# Altium schematic symbol library Capacitor - Aluminium TH.SchLib: 4591 symbols (part 2 of 27) (continued)
## 50ZLJ680M12.5X25 (continued)
CAP ALUM 680UF 20% 50V RADIAL; Part Number: 50ZLJ680M12.5X25; Manufacturer: Rubycon; TemperatureRange: -40C ~ 105C; Type: Polar; Ripple Current: 1.54A @ 120Hz; Impedance: 25 mOhm; Value: 680uF; PartId: 24049; Supplier 1: Digi-Key; Supplier Part Number 1: 1189-1436-ND; ComponentLink1Description: Datasheet; ComponentLink1URL: http://www.rubycon.co.jp/en/catalog/e_pdfs/aluminum/e_zlj.pdf; ComponentLink2Description: Digi-Key Listing; ComponentLink2URL: https://www.digikey.com/product-detail/en/rubycon/50ZLJ680M12.5X25/1189-1436-ND/3134392; Tolerance: 20%; Voltage: 50V; Price: 1.15; Device Package: Radial, Can, 12.5mm
footprint CAP AL TH D12.5 L5 H27
pins: 1, 2

## 50ZLJ820M12.5X30
designator C?, comment 820uF  (value not drawn)
CAP ALUM 820UF 20% 50V RADIAL; Part Number: 50ZLJ820M12.5X30; Manufacturer: Rubycon; TemperatureRange: -40C ~ 105C; Type: Polar; Ripple Current: 2.022A @ 120Hz; Impedance: 23 mOhm; Value: 820uF; PartId: 24350; Supplier 1: Digi-Key; Supplier Part Number 1: 1189-1437-ND; ComponentLink1Description: Datasheet; ComponentLink1URL: http://www.rubycon.co.jp/en/catalog/e_pdfs/aluminum/e_zlj.pdf; ComponentLink2Description: Digi-Key Listing; ComponentLink2URL: https://www.digikey.com/product-detail/en/rubycon/50ZLJ820M12.5X30/1189-1437-ND/3134393; Tolerance: 20%; Voltage: 50V; Price: 1.39; Device Package: Radial, Can, 12.5mm
footprint CAP AL TH D12.5 L5 H35.5
pins: 1, 2

## 50ZLJ1000M16X25
designator C?, comment 1000uF  (value not drawn)
CAP ALUM 1000UF 20% 50V RADIAL; Part Number: 50ZLJ1000M16X25; Manufacturer: Rubycon; TemperatureRange: -40C ~ 105C; Type: Polar; Ripple Current: 2.106A @ 120Hz; Impedance: 22 mOhm; Value: 1000uF; PartId: 26922; Supplier 1: Digi-Key; Supplier Part Number 1: 1189-1430-ND; ComponentLink1Description: Datasheet; ComponentLink1URL: http://www.rubycon.co.jp/en/catalog/e_pdfs/aluminum/e_zlj.pdf; ComponentLink2Description: Digi-Key Listing; ComponentLink2URL: https://www.digikey.com/product-detail/en/rubycon/50ZLJ1000M16X25/1189-1430-ND/3134386; Tolerance: 20%; Voltage: 50V; Price: 1.7; Device Package: Radial, Can, 16mm
footprint CAP AL TH D16 L7.5 H27
pins: 1, 2

## 63PX330MEFC10X20
designator C?, comment 330uF  (value not drawn)
CAP ALUM 330UF 20% 63V RADIAL; Part Number: 63PX330MEFC10X20; Manufacturer: Rubycon; TemperatureRange: -55C ~ 105C; Type: Polar; Ripple Current: 540mA; Value: 330uF; PartId: 25676; Supplier 1: Digi-Key; Supplier Part Number 1: 1189-1476-ND; ComponentLink1Description: Datasheet; ComponentLink1URL: http://www.rubycon.co.jp/en/catalog/e_pdfs/aluminum/e_px.pdf; ComponentLink2Description: Digi-Key Listing; ComponentLink2URL: https://www.digikey.com/product-detail/en/rubycon/63PX330MEFC10X20/1189-1476-ND/3134432; Tolerance: 20%; Voltage: 63V; Price: 0.78; Device Package: Radial, Can, 10mm
footprint CAP AL TH D10 L5 H22
pins: 1, 2

## 63PX470MEFC12.5X20
designator C?, comment 470uF  (value not drawn)
CAP ALUM 470UF 20% 63V RADIAL; Part Number: 63PX470MEFC12.5X20; Manufacturer: Rubycon; TemperatureRange: -55C ~ 105C; Type: Polar; Ripple Current: 700mA; Value: 470uF; PartId: 23016; Supplier 1: Digi-Key; Supplier Part Number 1: 1189-1478-ND; ComponentLink1Description: Datasheet; ComponentLink1URL: http://www.rubycon.co.jp/en/catalog/e_pdfs/aluminum/e_px.pdf; ComponentLink2Description: Digi-Key Listing; ComponentLink2URL: https://www.digikey.com/product-detail/en/rubycon/63PX470MEFC12.5X20/1189-1478-ND/3134434; Tolerance: 20%; Voltage: 63V; Price: 0; Device Package: Radial, Can, 12.5mm
footprint CAP AL TH D12.5 L5 H21.5
pins: 1, 2

## 63PX1000MEFC16X25
designator C?, comment 1000uF  (value not drawn)
CAP ALUM 1000UF 20% 63V RADIAL; Part Number: 63PX1000MEFC16X25; Manufacturer: Rubycon; TemperatureRange: -55C ~ 105C; Type: Polar; Ripple Current: 1.2A; Value: 1000uF; PartId: 26604; Supplier 1: Digi-Key; Supplier Part Number 1: 1189-1473-ND; ComponentLink1Description: Datasheet; ComponentLink1URL: http://www.rubycon.co.jp/en/catalog/e_pdfs/aluminum/e_px.pdf; ComponentLink2Description: Digi-Key Listing; ComponentLink2URL: https://www.digikey.com/product-detail/en/rubycon/63PX1000MEFC16X25/1189-1473-ND/3134429; Tolerance: 20%; Voltage: 63V; Price: 1.36; Device Package: Radial, Can, 16mm
footprint CAP AL TH D16 L7.5 H26.5
pins: 1, 2

## 63RX30100M10X16
designator C?, comment 100uF  (value not drawn)
CAP ALUM 100UF 20% 63V RADIAL; Part Number: 63RX30100M10X16; Manufacturer: Rubycon; TemperatureRange: -40C ~ 130C; Type: Polar; Ripple Current: 315mA; Impedance: 200 mOhm; Value: 100uF; PartId: 25525; Supplier 1: Digi-Key; Supplier Part Number 1: 1189-1480-ND; ComponentLink1Description: Datasheet; ComponentLink1URL: http://www.rubycon.co.jp/en/catalog/e_pdfs/aluminum/e_rx30.pdf; ComponentLink2Description: Digi-Key Listing; ComponentLink2URL: https://www.digikey.com/product-detail/en/rubycon/63RX30100M10X16/1189-1480-ND/3134436; Tolerance: 20%; Voltage: 63V; Price: 0.6; Device Package: Radial, Can, 10mm
footprint CAP AL TH D10 L5 H22
pins: 1, 2

## 63RX30220MG412.5X20
designator C?, comment 220uF  (value not drawn)
CAP ALUM 220UF 20% 63V RADIAL; Part Number: 63RX30220MG412.5X20; Manufacturer: Rubycon; TemperatureRange: -40C ~ 130C; Type: Polar; Ripple Current: 574mA; Impedance: 100 mOhm; Value: 220uF; PartId: 23395; Supplier 1: Digi-Key; Supplier Part Number 1: 1189-1676-1-ND; ComponentLink1Description: Datasheet; ComponentLink1URL: http://www.rubycon.co.jp/en/catalog/e_pdfs/aluminum/e_rx30.pdf; ComponentLink2Description: Digi-Key Listing; ComponentLink2URL: https://www.digikey.com/product-detail/en/rubycon/63RX30220MG412.5X20/1189-1676-1-ND/3134633; Tolerance: 20%; Voltage: 63V; Price: 0.96; Device Package: Radial, Can, 12.5mm
footprint CAP AL TH D12.5 L5 H22
pins: 1, 2

## 63RX30330MG412.5X25
designator C?, comment 330uF  (value not drawn)
CAP ALUM 330UF 20% 63V RADIAL; Part Number: 63RX30330MG412.5X25; Manufacturer: Rubycon; TemperatureRange: -40C ~ 130C; Type: Polar; Ripple Current: 1A; Impedance: 72 mOhm; Value: 330uF; PartId: 24126; Supplier 1: Digi-Key; Supplier Part Number 1: 1189-1677-1-ND; ComponentLink1Description: Datasheet; ComponentLink1URL: http://www.rubycon.co.jp/en/catalog/e_pdfs/aluminum/e_rx30.pdf; ComponentLink2Description: Digi-Key Listing; ComponentLink2URL: https://www.digikey.com/product-detail/en/rubycon/63RX30330MG412.5X25/1189-1677-1-ND/3134634; Tolerance: 20%; Voltage: 63V; Price: 1.43; Device Package: Radial, Can, 12.5mm
footprint CAP AL TH D12.5 L5 H27
pins: 1, 2

## 63YXG120MEFC10X16
designator C?, comment 120uF  (value not drawn)
CAP ALUM 120UF 20% 63V RADIAL; Part Number: 63YXG120MEFC10X16; Manufacturer: Rubycon; TemperatureRange: -40C ~ 105C; Type: Polar; Ripple Current: 178.5mA @ 120Hz; Impedance: 310 mOhm; Value: 120uF; PartId: 25353; Supplier 1: Digi-Key; Supplier Part Number 1: 1189-1491-ND; ComponentLink1Description: Datasheet; ComponentLink1URL: http://www.rubycon.co.jp/en/catalog/e_pdfs/aluminum/e_yxg.pdf; ComponentLink2Description: Digi-Key Listing; ComponentLink2URL: https://www.digikey.com/product-detail/en/rubycon/63YXG120MEFC10X16/1189-1491-ND/3134447; Tolerance: 20%; Voltage: 63V; Price: 0.69; Device Package: Radial, Can, 10mm
footprint CAP AL TH D10 L5 H17.5
pins: 1, 2

## 63YXJ470M12.5X25
designator C?, comment 470uF  (value not drawn)
CAP ALUM 470UF 20% 63V RADIAL; Part Number: 63YXJ470M12.5X25; Manufacturer: Rubycon; TemperatureRange: -40C ~ 105C; Type: Polar; Ripple Current: 1.99A; Impedance: 43 mOhm; Value: 470uF; PartId: 23873; Supplier 1: Digi-Key; Supplier Part Number 1: 1189-1501-ND; ComponentLink1Description: Datasheet; ComponentLink1URL: http://www.rubycon.co.jp/en/catalog/e_pdfs/aluminum/e_yxj.pdf; ComponentLink2Description: Digi-Key Listing; ComponentLink2URL: https://www.digikey.com/product-detail/en/rubycon/63YXJ470M12.5X25/1189-1501-ND/3134457; Tolerance: 20%; Voltage: 63V; Price: 0.82; Device Package: Radial, Can, 12.5mm
footprint CAP AL TH D12.5 L5 H27
pins: 1, 2

## 63ZLH270MEFC10X20
designator C?, comment 270uF  (value not drawn)
CAP ALUM 270UF 20% 63V RADIAL; Part Number: 63ZLH270MEFC10X20; Manufacturer: Rubycon; TemperatureRange: -40C ~ 105C; Type: Polar; Ripple Current: 600mA @ 120Hz; Impedance: 78 mOhm; Value: 270uF; PartId: 25954; Supplier 1: Digi-Key; Supplier Part Number 1: 1189-3031-ND; ComponentLink1Description: Datasheet; ComponentLink1URL: http://www.rubycon.co.jp/en/catalog/e_pdfs/aluminum/e_zlh.pdf; ComponentLink2Description: Digi-Key Listing; ComponentLink2URL: https://www.digikey.com/product-detail/en/rubycon/63ZLH270MEFC10X20/1189-3031-ND/3563820; Tolerance: 20%; Voltage: 63V; Price: 0.78; Device Package: Radial, Can, 10mm
footprint CAP AL TH D10 L5 H22
pins: 1, 2

## 63ZLH270MEFC12.5X16
designator C?, comment 270uF  (value not drawn)
CAP ALUM 270UF 20% 63V RADIAL; Part Number: 63ZLH270MEFC12.5X16; Manufacturer: Rubycon; TemperatureRange: -40C ~ 105C; Type: Polar; Ripple Current: 600mA; Impedance: 82 mOhm; Value: 270uF; PartId: 22828; Supplier 1: Digi-Key; Supplier Part Number 1: 1189-2357-ND; ComponentLink1Description: Datasheet; ComponentLink1URL: http://www.rubycon.co.jp/en/catalog/e_pdfs/aluminum/e_zlh.pdf; ComponentLink2Description: Digi-Key Listing; ComponentLink2URL: https://www.digikey.com/product-detail/en/rubycon/63ZLH270MEFC12.5X16/1189-2357-ND/3563974; Tolerance: 20%; Voltage: 63V; Price: 0; Device Package: Radial, Can, 12.5mm
footprint CAP AL TH D12.5 L5 H17.5
pins: 1, 2

## 63ZLH330MEFC10X23
designator C?, comment 330uF  (value not drawn)
CAP ALUM 330UF 20% 63V RADIAL; Part Number: 63ZLH330MEFC10X23; Manufacturer: Rubycon; TemperatureRange: -40C ~ 105C; Type: Polar; Ripple Current: 775.5mA; Impedance: 69 mOhm; Value: 330uF; PartId: 26140; Supplier 1: Digi-Key; Supplier Part Number 1: 1189-1766-ND; ComponentLink1Description: Datasheet; ComponentLink1URL: http://www.rubycon.co.jp/en/catalog/e_pdfs/aluminum/e_zlh.pdf; ComponentLink2Description: Digi-Key Listing; ComponentLink2URL: https://www.digikey.com/product-detail/en/rubycon/63ZLH330MEFC10X23/1189-1766-ND/3563862; Tolerance: 20%; Voltage: 63V; Price: 0.83; Device Package: Radial, Can, 10mm
footprint CAP AL TH D10 L5 H30
pins: 1, 2

## 63ZLH390MEFC12.5X20
designator C?, comment 390uF  (value not drawn)
CAP ALUM 390UF 20% 63V RADIAL; Part Number: 63ZLH390MEFC12.5X20; Manufacturer: Rubycon; TemperatureRange: -40C ~ 105C; Type: Polar; Ripple Current: 863.5mA @ 120Hz; Impedance: 60 mOhm; Value: 390uF; PartId: 23464; Supplier 1: Digi-Key; Supplier Part Number 1: 1189-3032-ND; ComponentLink1Description: Datasheet; ComponentLink1URL: http://www.rubycon.co.jp/en/catalog/e_pdfs/aluminum/e_zlh.pdf; ComponentLink2Description: Digi-Key Listing; ComponentLink2URL: https://www.digikey.com/product-detail/en/rubycon/63ZLH390MEFC12.5X20/1189-3032-ND/3564060; Tolerance: 20%; Voltage: 63V; Price: 1.07; Device Package: Radial, Can, 12.5mm
footprint CAP AL TH D12.5 L5 H22
pins: 1, 2

## 63ZLH470MEFC12.5X25
designator C?, comment 470uF  (value not drawn)
CAP ALUM 470UF 20% 63V RADIAL; Part Number: 63ZLH470MEFC12.5X25; Manufacturer: Rubycon; TemperatureRange: -40C ~ 105C; Type: Polar; Ripple Current: 1.0945A @ 120Hz; Impedance: 43 mOhm; Value: 470uF; PartId: 24069; Supplier 1: Digi-Key; Supplier Part Number 1: 1189-3033-ND; ComponentLink1Description: Datasheet; ComponentLink1URL: http://www.rubycon.co.jp/en/catalog/e_pdfs/aluminum/e_zlh.pdf; ComponentLink2Description: Digi-Key Listing; ComponentLink2URL: https://www.digikey.com/product-detail/en/rubycon/63ZLH470MEFC12.5X25/1189-3033-ND/3564146; Tolerance: 20%; Voltage: 63V; Price: 1.2; Device Package: Radial, Can, 12.5mm
footprint CAP AL TH D12.5 L5 H27
pins: 1, 2

## 63ZLH560MEFC12.5X30
designator C?, comment 560uF  (value not drawn)
CAP ALUM 560UF 20% 63V RADIAL; Part Number: 63ZLH560MEFC12.5X30; Manufacturer: Rubycon; TemperatureRange: -40C ~ 105C; Type: Polar; Ripple Current: 1.326A; Impedance: 35 mOhm; Value: 560uF; PartId: 24275; Supplier 1: Digi-Key; Supplier Part Number 1: 1189-1507-ND; ComponentLink1Description: Datasheet; ComponentLink1URL: http://www.rubycon.co.jp/en/catalog/e_pdfs/aluminum/e_zlh.pdf; ComponentLink2Description: Digi-Key Listing; ComponentLink2URL: https://www.digikey.com/product-detail/en/rubycon/63ZLH560MEFC12.5X30/1189-1507-ND/3134463; Tolerance: 20%; Voltage: 63V; Price: 1.08; Device Package: Radial, Can, 12.5mm
footprint CAP AL TH D12.5 L5 H35.5
pins: 1, 2

## 63ZLH560MEFC16X20
designator C?, comment 560uF  (value not drawn)
CAP ALUM 560UF 20% 63V RADIAL; Part Number: 63ZLH560MEFC16X20; Manufacturer: Rubycon; TemperatureRange: -40C ~ 105C; Type: Polar; Ripple Current: 1.155A @ 120Hz; Impedance: 43 mOhm; Value: 560uF; PartId: 26466; Supplier 1: Digi-Key; Supplier Part Number 1: 1189-3035-ND; ComponentLink1Description: Datasheet; ComponentLink1URL: http://www.rubycon.co.jp/en/catalog/e_pdfs/aluminum/e_zlh.pdf; ComponentLink2Description: Digi-Key Listing; ComponentLink2URL: https://www.digikey.com/product-detail/en/rubycon/63ZLH560MEFC16X20/1189-3035-ND/3564404; Tolerance: 20%; Voltage: 63V; Price: 1.55; Device Package: Radial, Can, 16mm
footprint CAP AL TH D16 L7.5 H22
pins: 1, 2

## 63ZLH820MEFC16X25
designator C?, comment 820uF  (value not drawn)
CAP ALUM 820UF 20% 63V RADIAL; Part Number: 63ZLH820MEFC16X25; Manufacturer: Rubycon; TemperatureRange: -40C ~ 105C; Type: Polar; Ripple Current: 1.638A @ 120Hz; Impedance: 32 mOhm; Value: 820uF; PartId: 26932; Supplier 1: Digi-Key; Supplier Part Number 1: 1189-3037-ND; ComponentLink1Description: Datasheet; ComponentLink1URL: http://www.rubycon.co.jp/en/catalog/e_pdfs/aluminum/e_zlh.pdf; ComponentLink2Description: Digi-Key Listing; ComponentLink2URL: https://www.digikey.com/product-detail/en/rubycon/63ZLH820MEFC16X25/1189-3037-ND/3564487; Tolerance: 20%; Voltage: 63V; Price: 1.82; Device Package: Radial, Can, 16mm
footprint CAP AL TH D16 L7.5 H27
pins: 1, 2

## 63ZLH1200MEFC16X31.5
designator C?, comment 1200uF  (value not drawn)
CAP ALUM 1200UF 20% 63V RADIAL; Part Number: 63ZLH1200MEFC16X31.5; Manufacturer: Rubycon; TemperatureRange: -40C ~ 105C; Type: Polar; Ripple Current: 1.794A; Impedance: 24 mOhm; Value: 1200uF; PartId: 27170; Supplier 1: Digi-Key; Supplier Part Number 1: 1189-1503-ND; ComponentLink1Description: Datasheet; ComponentLink1URL: http://www.rubycon.co.jp/en/catalog/e_pdfs/aluminum/e_zlh.pdf; ComponentLink2Description: Digi-Key Listing; ComponentLink2URL: https://www.digikey.com/product-detail/en/rubycon/63ZLH1200MEFC16X31.5/1189-1503-ND/3134459; Tolerance: 20%; Voltage: 63V; Price: 1.9; Device Package: Radial, Can, 16mm
footprint CAP AL TH D16 L7.5 H33.5
pins: 1, 2

## 63ZLJ180M10X16
designator C?, comment 180uF  (value not drawn)
CAP ALUM 180UF 20% 63V RADIAL; Part Number: 63ZLJ180M10X16; Manufacturer: Rubycon; TemperatureRange: -40C ~ 105C; Type: Polar; Ripple Current: 600mA @ 120Hz; Impedance: 76 mOhm; Value: 180uF; PartId: 25415; Supplier 1: Digi-Key; Supplier Part Number 1: 1189-2360-ND; ComponentLink1Description: Datasheet; ComponentLink1URL: http://www.rubycon.co.jp/en/catalog/e_pdfs/aluminum/e_zlj.pdf; ComponentLink2Description: Digi-Key Listing; ComponentLink2URL: https://www.digikey.com/product-detail/en/rubycon/63ZLJ180M10X16/1189-2360-ND/3563728; Tolerance: 20%; Voltage: 63V; Price: 0.9; Device Package: Radial, Can, 10mm
footprint CAP AL TH D10 L5 H17.5
pins: 1, 2

## 63ZLJ270M10X20
designator C?, comment 270uF  (value not drawn)
CAP ALUM 270UF 20% 63V RADIAL; Part Number: 63ZLJ270M10X20; Manufacturer: Rubycon; TemperatureRange: -40C ~ 105C; Type: Polar; Ripple Current: 785mA @ 120Hz; Impedance: 56 mOhm; Value: 270uF; PartId: 25935; Supplier 1: Digi-Key; Supplier Part Number 1: 1189-1510-ND; ComponentLink1Description: Datasheet; ComponentLink1URL: http://www.rubycon.co.jp/en/catalog/e_pdfs/aluminum/e_zlj.pdf; ComponentLink2Description: Digi-Key Listing; ComponentLink2URL: https://www.digikey.com/product-detail/en/rubycon/63ZLJ270M10X20/1189-1510-ND/3134466; Tolerance: 20%; Voltage: 63V; Price: 0.74; Device Package: Radial, Can, 10mm
footprint CAP AL TH D10 L5 H22
pins: 1, 2

## 63ZLJ470M12.5X25
designator C?, comment 470uF  (value not drawn)
CAP ALUM 470UF 20% 63V RADIAL; Part Number: 63ZLJ470M12.5X25; Manufacturer: Rubycon; TemperatureRange: -40C ~ 105C; Type: Polar; Ripple Current: 1.353A @ 120Hz; Impedance: 31 mOhm; Value: 470uF; PartId: 24113; Supplier 1: Digi-Key; Supplier Part Number 1: 1189-2362-ND; ComponentLink1Description: Datasheet; ComponentLink1URL: http://www.rubycon.co.jp/en/catalog/e_pdfs/aluminum/e_zlj.pdf; ComponentLink2Description: Digi-Key Listing; ComponentLink2URL: https://www.digikey.com/product-detail/en/rubycon/63ZLJ470M12.5X25/1189-2362-ND/3564153; Tolerance: 20%; Voltage: 63V; Price: 1.38; Device Package: Radial, Can, 12.5mm
footprint CAP AL TH D12.5 L5 H27
pins: 1, 2

## 63ZLJ560M12.5X30
designator C?, comment 560uF  (value not drawn)
CAP ALUM 560UF 20% 63V RADIAL; Part Number: 63ZLJ560M12.5X30; Manufacturer: Rubycon; TemperatureRange: -40C ~ 105C; Type: Polar; Ripple Current: 1.353A @ 120Hz; Impedance: 28 mOhm; Value: 560uF; PartId: 24375; Supplier 1: Digi-Key; Supplier Part Number 1: 1189-2363-ND; ComponentLink1Description: Datasheet; ComponentLink1URL: http://www.rubycon.co.jp/en/catalog/e_pdfs/aluminum/e_zlj.pdf; ComponentLink2Description: Digi-Key Listing; ComponentLink2URL: https://www.digikey.com/product-detail/en/rubycon/63ZLJ560M12.5X30/1189-2363-ND/3564208; Tolerance: 20%; Voltage: 63V; Price: 1.65; Device Package: Radial, Can, 12.5mm
footprint CAP AL TH D12.5 L5 H35.5
pins: 1, 2

## 63ZLJ560MGC16X20
designator C?, comment 560uF  (value not drawn)
CAP ALUM 560UF 20% 63V RADIAL; Part Number: 63ZLJ560MGC16X20; Manufacturer: Rubycon; TemperatureRange: -40C ~ 105C; Type: Polar; Ripple Current: 1.309A @ 120Hz; Impedance: 32 mOhm; Value: 560uF; PartId: 26382; Supplier 1: Digi-Key; Supplier Part Number 1: 1189-1679-3-ND; ComponentLink1Description: Datasheet; ComponentLink1URL: http://www.rubycon.co.jp/en/catalog/e_pdfs/aluminum/e_zlj.pdf; ComponentLink2Description: Digi-Key Listing; ComponentLink2URL: https://www.digikey.com/product-detail/en/rubycon/63ZLJ560MGC16X20/1189-1679-3-ND/3134958; Tolerance: 20%; Voltage: 63V; Price: 0.771; Device Package: Radial, Can, 16mm
footprint CAP AL TH D16 L7.5 H22
pins: 1, 2

## 80ZLH120MEFC10X16
designator C?, comment 120uF  (value not drawn)
CAP ALUM 120UF 20% 80V RADIAL; Part Number: 80ZLH120MEFC10X16; Manufacturer: Rubycon; TemperatureRange: -40C ~ 105C; Type: Polar; Ripple Current: 390mA @ 120Hz; Impedance: 170 mOhm; Value: 120uF; PartId: 25325; Supplier 1: Digi-Key; Supplier Part Number 1: 1189-3043-ND; ComponentLink1Description: Datasheet; ComponentLink1URL: http://www.rubycon.co.jp/en/catalog/e_pdfs/aluminum/e_zlh.pdf; ComponentLink2Description: Digi-Key Listing; ComponentLink2URL: https://www.digikey.com/product-detail/en/rubycon/80ZLH120MEFC10X16/1189-3043-ND/3563726; Tolerance: 20%; Voltage: 80V; Price: 0.66; Device Package: Radial, Can, 10mm
footprint CAP AL TH D10 L5 H17.5
pins: 1, 2

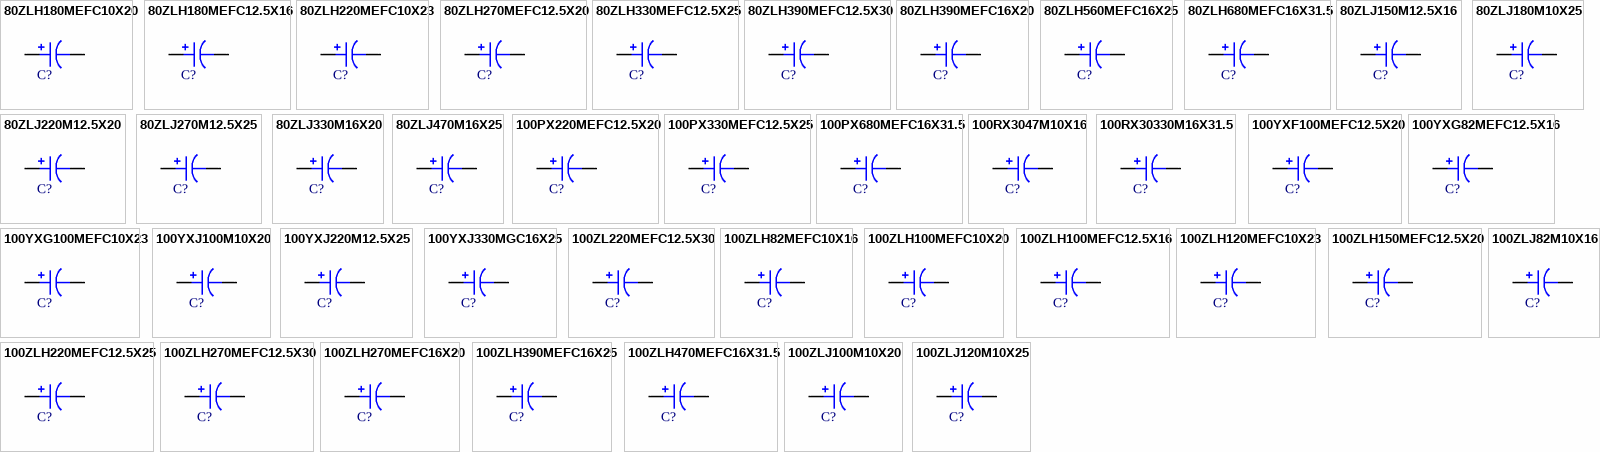
[diagram p7: symbols 80ZLH180MEFC10X20 to 100ZLJ120M10X25]

## 80ZLH180MEFC10X20
designator C?, comment 180uF  (value not drawn)
CAP ALUM 180UF 20% 80V RADIAL; Part Number: 80ZLH180MEFC10X20; Manufacturer: Rubycon; TemperatureRange: -40C ~ 105C; Type: Polar; Ripple Current: 520mA @ 120Hz; Impedance: 120 mOhm; Value: 180uF; PartId: 25959; Supplier 1: Digi-Key; Supplier Part Number 1: 1189-3046-ND; ComponentLink1Description: Datasheet; ComponentLink1URL: http://www.rubycon.co.jp/en/catalog/e_pdfs/aluminum/e_zlh.pdf; ComponentLink2Description: Digi-Key Listing; ComponentLink2URL: https://www.digikey.com/product-detail/en/rubycon/80ZLH180MEFC10X20/1189-3046-ND/3563821; Tolerance: 20%; Voltage: 80V; Price: 0.81; Device Package: Radial, Can, 10mm
footprint CAP AL TH D10 L5 H22
pins: 1, 2

## 80ZLH180MEFC12.5X16
designator C?, comment 180uF  (value not drawn)
CAP ALUM 180UF 20% 80V RADIAL; Part Number: 80ZLH180MEFC12.5X16; Manufacturer: Rubycon; TemperatureRange: -40C ~ 105C; Type: Polar; Ripple Current: 487.5mA @ 120Hz; Impedance: 130 mOhm; Value: 180uF; PartId: 22818; Supplier 1: Digi-Key; Supplier Part Number 1: 1189-3047-ND; ComponentLink1Description: Datasheet; ComponentLink1URL: http://www.rubycon.co.jp/en/catalog/e_pdfs/aluminum/e_zlh.pdf; ComponentLink2Description: Digi-Key Listing; ComponentLink2URL: https://www.digikey.com/product-detail/en/rubycon/80ZLH180MEFC12.5X16/1189-3047-ND/3563975; Tolerance: 20%; Voltage: 80V; Price: 0; Device Package: Radial, Can, 12.5mm
footprint CAP AL TH D12.5 L5 H17.5
pins: 1, 2

## 80ZLH220MEFC10X23
designator C?, comment 220uF  (value not drawn)
CAP ALUM 220UF 20% 80V RADIAL; Part Number: 80ZLH220MEFC10X23; Manufacturer: Rubycon; TemperatureRange: -40C ~ 105C; Type: Polar; Ripple Current: 585mA @ 120Hz; Impedance: 110 mOhm; Value: 220uF; PartId: 26157; Supplier 1: Digi-Key; Supplier Part Number 1: 1189-3048-ND; ComponentLink1Description: Datasheet; ComponentLink1URL: http://www.rubycon.co.jp/en/catalog/e_pdfs/aluminum/e_zlh.pdf; ComponentLink2Description: Digi-Key Listing; ComponentLink2URL: https://www.digikey.com/product-detail/en/rubycon/80ZLH220MEFC10X23/1189-3048-ND/3563865; Tolerance: 20%; Voltage: 80V; Price: 0.86; Device Package: Radial, Can, 10mm
footprint CAP AL TH D10 L5 H30
pins: 1, 2

## 80ZLH270MEFC12.5X20
designator C?, comment 270uF  (value not drawn)
CAP ALUM 270UF 20% 80V RADIAL; Part Number: 80ZLH270MEFC12.5X20; Manufacturer: Rubycon; TemperatureRange: -40C ~ 105C; Type: Polar; Ripple Current: 715mA @ 120Hz; Impedance: 85 mOhm; Value: 270uF; PartId: 23435; Supplier 1: Digi-Key; Supplier Part Number 1: 1189-3049-ND; ComponentLink1Description: Datasheet; ComponentLink1URL: http://www.rubycon.co.jp/en/catalog/e_pdfs/aluminum/e_zlh.pdf; ComponentLink2Description: Digi-Key Listing; ComponentLink2URL: https://www.digikey.com/product-detail/en/rubycon/80ZLH270MEFC12.5X20/1189-3049-ND/3564063; Tolerance: 20%; Voltage: 80V; Price: 1.01; Device Package: Radial, Can, 12.5mm
footprint CAP AL TH D12.5 L5 H22
pins: 1, 2

## 80ZLH330MEFC12.5X25
designator C?, comment 330uF  (value not drawn)
CAP ALUM 330UF 20% 80V RADIAL; Part Number: 80ZLH330MEFC12.5X25; Manufacturer: Rubycon; TemperatureRange: -40C ~ 105C; Type: Polar; Ripple Current: 891mA @ 120Hz; Impedance: 60 mOhm; Value: 330uF; PartId: 24065; Supplier 1: Digi-Key; Supplier Part Number 1: 1189-3050-ND; ComponentLink1Description: Datasheet; ComponentLink1URL: http://www.rubycon.co.jp/en/catalog/e_pdfs/aluminum/e_zlh.pdf; ComponentLink2Description: Digi-Key Listing; ComponentLink2URL: https://www.digikey.com/product-detail/en/rubycon/80ZLH330MEFC12.5X25/1189-3050-ND/3564148; Tolerance: 20%; Voltage: 80V; Price: 1.19; Device Package: Radial, Can, 12.5mm
footprint CAP AL TH D12.5 L5 H27
pins: 1, 2

## 80ZLH390MEFC12.5X30
designator C?, comment 390uF  (value not drawn)
CAP ALUM 390UF 20% 80V RADIAL; Part Number: 80ZLH390MEFC12.5X30; Manufacturer: Rubycon; TemperatureRange: -40C ~ 105C; Type: Polar; Ripple Current: 1.0725A @ 120Hz; Impedance: 51 mOhm; Value: 390uF; PartId: 24354; Supplier 1: Digi-Key; Supplier Part Number 1: 1189-3052-ND; ComponentLink1Description: Datasheet; ComponentLink1URL: http://www.rubycon.co.jp/en/catalog/e_pdfs/aluminum/e_zlh.pdf; ComponentLink2Description: Digi-Key Listing; ComponentLink2URL: https://www.digikey.com/product-detail/en/rubycon/80ZLH390MEFC12.5X30/1189-3052-ND/3564203; Tolerance: 20%; Voltage: 80V; Price: 1.43; Device Package: Radial, Can, 12.5mm
footprint CAP AL TH D12.5 L5 H35.5
pins: 1, 2

## 80ZLH390MEFC16X20
designator C?, comment 390uF  (value not drawn)
CAP ALUM 390UF 20% 80V RADIAL; Part Number: 80ZLH390MEFC16X20; Manufacturer: Rubycon; TemperatureRange: -40C ~ 105C; Type: Polar; Ripple Current: 962.5mA @ 120Hz; Impedance: 58 mOhm; Value: 390uF; PartId: 26465; Supplier 1: Digi-Key; Supplier Part Number 1: 1189-3053-ND; ComponentLink1Description: Datasheet; ComponentLink1URL: http://www.rubycon.co.jp/en/catalog/e_pdfs/aluminum/e_zlh.pdf; ComponentLink2Description: Digi-Key Listing; ComponentLink2URL: https://www.digikey.com/product-detail/en/rubycon/80ZLH390MEFC16X20/1189-3053-ND/3564406; Tolerance: 20%; Voltage: 80V; Price: 1.55; Device Package: Radial, Can, 16mm
footprint CAP AL TH D16 L7.5 H22
pins: 1, 2

## 80ZLH560MEFC16X25
designator C?, comment 560uF  (value not drawn)
CAP ALUM 560UF 20% 80V RADIAL; Part Number: 80ZLH560MEFC16X25; Manufacturer: Rubycon; TemperatureRange: -40C ~ 105C; Type: Polar; Ripple Current: 1.2155A @ 120Hz; Impedance: 44 mOhm; Value: 560uF; PartId: 26933; Supplier 1: Digi-Key; Supplier Part Number 1: 1189-3056-ND; ComponentLink1Description: Datasheet; ComponentLink1URL: http://www.rubycon.co.jp/en/catalog/e_pdfs/aluminum/e_zlh.pdf; ComponentLink2Description: Digi-Key Listing; ComponentLink2URL: https://www.digikey.com/product-detail/en/rubycon/80ZLH560MEFC16X25/1189-3056-ND/3564490; Tolerance: 20%; Voltage: 80V; Price: 1.82; Device Package: Radial, Can, 16mm
footprint CAP AL TH D16 L7.5 H27
pins: 1, 2

## 80ZLH680MEFC16X31.5
designator C?, comment 680uF  (value not drawn)
CAP ALUM 680UF 20% 80V RADIAL; Part Number: 80ZLH680MEFC16X31.5; Manufacturer: Rubycon; TemperatureRange: -40C ~ 105C; Type: Polar; Ripple Current: 1.32A @ 120Hz; Impedance: 33 mOhm; Value: 680uF; PartId: 27208; Supplier 1: Digi-Key; Supplier Part Number 1: 1189-3059-ND; ComponentLink1Description: Datasheet; ComponentLink1URL: http://www.rubycon.co.jp/en/catalog/e_pdfs/aluminum/e_zlh.pdf; ComponentLink2Description: Digi-Key Listing; ComponentLink2URL: https://www.digikey.com/product-detail/en/rubycon/80ZLH680MEFC16X31.5/1189-3059-ND/3564547; Tolerance: 20%; Voltage: 80V; Price: 2.16; Device Package: Radial, Can, 16mm
footprint CAP AL TH D16 L7.5 H33.5
pins: 1, 2

## 80ZLJ150M12.5X16
designator C?, comment 150uF  (value not drawn)
CAP ALUM 150UF 20% 80V RADIAL; Part Number: 80ZLJ150M12.5X16; Manufacturer: Rubycon; TemperatureRange: -40C ~ 105C; Type: Polar; Ripple Current: 715mA @ 120Hz; Impedance: 110 mOhm; Value: 150uF; PartId: 22830; Supplier 1: Digi-Key; Supplier Part Number 1: 1189-2365-ND; ComponentLink1Description: Datasheet; ComponentLink1URL: http://www.rubycon.co.jp/en/catalog/e_pdfs/aluminum/e_zlj.pdf; ComponentLink2Description: Digi-Key Listing; ComponentLink2URL: https://www.digikey.com/product-detail/en/rubycon/80ZLJ150M12.5X16/1189-2365-ND/3563978; Tolerance: 20%; Voltage: 80V; Price: 0; Device Package: Radial, Can, 12.5mm
footprint CAP AL TH D12.5 L5 H17.5
pins: 1, 2

## 80ZLJ180M10X25
designator C?, comment 180uF  (value not drawn)
CAP ALUM 180UF 20% 80V RADIAL; Part Number: 80ZLJ180M10X25; Manufacturer: Rubycon; TemperatureRange: -40C ~ 105C; Type: Polar; Ripple Current: 810mA @ 120Hz; Impedance: 69 mOhm; Value: 180uF; PartId: 26186; Supplier 1: Digi-Key; Supplier Part Number 1: 1189-2366-ND; ComponentLink1Description: Datasheet; ComponentLink1URL: http://www.rubycon.co.jp/en/catalog/e_pdfs/aluminum/e_zlj.pdf; ComponentLink2Description: Digi-Key Listing; ComponentLink2URL: https://www.digikey.com/product-detail/en/rubycon/80ZLJ180M10X25/1189-2366-ND/3563878; Tolerance: 20%; Voltage: 80V; Price: 1.02; Device Package: Radial, Can, 10mm
footprint CAP AL TH D10 L5 H30
pins: 1, 2

## 80ZLJ220M12.5X20
designator C?, comment 220uF  (value not drawn)
CAP ALUM 220UF 20% 80V RADIAL; Part Number: 80ZLJ220M12.5X20; Manufacturer: Rubycon; TemperatureRange: -40C ~ 105C; Type: Polar; Ripple Current: 875mA @ 120Hz; Impedance: 62 mOhm; Value: 220uF; PartId: 23487; Supplier 1: Digi-Key; Supplier Part Number 1: 1189-2367-ND; ComponentLink1Description: Datasheet; ComponentLink1URL: http://www.rubycon.co.jp/en/catalog/e_pdfs/aluminum/e_zlj.pdf; ComponentLink2Description: Digi-Key Listing; ComponentLink2URL: https://www.digikey.com/product-detail/en/rubycon/80ZLJ220M12.5X20/1189-2367-ND/3564071; Tolerance: 20%; Voltage: 80V; Price: 1.17; Device Package: Radial, Can, 12.5mm
footprint CAP AL TH D12.5 L5 H22
pins: 1, 2

## 80ZLJ270M12.5X25
designator C?, comment 270uF  (value not drawn)
CAP ALUM 270UF 20% 80V RADIAL; Part Number: 80ZLJ270M12.5X25; Manufacturer: Rubycon; TemperatureRange: -40C ~ 105C; Type: Polar; Ripple Current: 1.105A @ 120Hz; Impedance: 47 mOhm; Value: 270uF; PartId: 24114; Supplier 1: Digi-Key; Supplier Part Number 1: 1189-2368-ND; ComponentLink1Description: Datasheet; ComponentLink1URL: http://www.rubycon.co.jp/en/catalog/e_pdfs/aluminum/e_zlj.pdf; ComponentLink2Description: Digi-Key Listing; ComponentLink2URL: https://www.digikey.com/product-detail/en/rubycon/80ZLJ270M12.5X25/1189-2368-ND/3564155; Tolerance: 20%; Voltage: 80V; Price: 1.39; Device Package: Radial, Can, 12.5mm
footprint CAP AL TH D12.5 L5 H27
pins: 1, 2

## 80ZLJ330M16X20
designator C?, comment 330uF  (value not drawn)
CAP ALUM 330UF 20% 80V RADIAL; Part Number: 80ZLJ330M16X20; Manufacturer: Rubycon; TemperatureRange: -40C ~ 105C; Type: Polar; Ripple Current: 1.072A @ 120Hz; Impedance: 48 mOhm; Value: 330uF; PartId: 26479; Supplier 1: Digi-Key; Supplier Part Number 1: 1189-2370-ND; ComponentLink1Description: Datasheet; ComponentLink1URL: http://www.rubycon.co.jp/en/catalog/e_pdfs/aluminum/e_zlj.pdf; ComponentLink2Description: Digi-Key Listing; ComponentLink2URL: https://www.digikey.com/product-detail/en/rubycon/80ZLJ330M16X20/1189-2370-ND/3564415; Tolerance: 20%; Voltage: 80V; Price: 1.79; Device Package: Radial, Can, 16mm
footprint CAP AL TH D16 L7.5 H22
pins: 1, 2

## 80ZLJ470M16X25
designator C?, comment 470uF  (value not drawn)
CAP ALUM 470UF 20% 80V RADIAL; Part Number: 80ZLJ470M16X25; Manufacturer: Rubycon; TemperatureRange: -40C ~ 105C; Type: Polar; Ripple Current: 1.336A @ 120Hz; Impedance: 38 mOhm; Value: 470uF; PartId: 26942; Supplier 1: Digi-Key; Supplier Part Number 1: 1189-2371-ND; ComponentLink1Description: Datasheet; ComponentLink1URL: http://www.rubycon.co.jp/en/catalog/e_pdfs/aluminum/e_zlj.pdf; ComponentLink2Description: Digi-Key Listing; ComponentLink2URL: https://www.digikey.com/product-detail/en/rubycon/80ZLJ470M16X25/1189-2371-ND/3564497; Tolerance: 20%; Voltage: 80V; Price: 1.89; Device Package: Radial, Can, 16mm
footprint CAP AL TH D16 L7.5 H27
pins: 1, 2

## 100PX220MEFC12.5X20
designator C?, comment 220uF  (value not drawn)
CAP ALUM 220UF 20% 100V RADIAL; Part Number: 100PX220MEFC12.5X20; Manufacturer: Rubycon; TemperatureRange: -55C ~ 105C; Type: Polar; Ripple Current: 560mA @ 120Hz; Value: 220uF; PartId: 23021; Supplier 1: Digi-Key; Supplier Part Number 1: 1189-3684-ND; ComponentLink1Description: Datasheet; ComponentLink1URL: http://www.rubycon.co.jp/en/catalog/e_pdfs/aluminum/e_px.pdf; ComponentLink2Description: Digi-Key Listing; ComponentLink2URL: https://www.digikey.com/product-detail/en/rubycon/100PX220MEFC12.5X20/1189-3684-ND/3564013; Tolerance: 20%; Voltage: 100V; Price: 0; Device Package: Radial, Can, 12.5mm
footprint CAP AL TH D12.5 L5 H21.5
pins: 1, 2

## 100PX330MEFC12.5X25
designator C?, comment 330uF  (value not drawn)
CAP ALUM 330UF 20% 100V RADIAL; Part Number: 100PX330MEFC12.5X25; Manufacturer: Rubycon; TemperatureRange: -55C ~ 105C; Type: Polar; Ripple Current: 690mA; Value: 330uF; PartId: 23726; Supplier 1: Digi-Key; Supplier Part Number 1: 1189-1003-ND; ComponentLink1Description: Datasheet; ComponentLink1URL: http://www.rubycon.co.jp/en/catalog/e_pdfs/aluminum/e_px.pdf; ComponentLink2Description: Digi-Key Listing; ComponentLink2URL: https://www.digikey.com/product-detail/en/rubycon/100PX330MEFC12.5X25/1189-1003-ND/3133931; Tolerance: 20%; Voltage: 100V; Price: 1.34; Device Package: Radial, Can, 12.5mm
footprint CAP AL TH D12.5 L5 H26.5
pins: 1, 2

## 100PX680MEFC16X31.5
designator C?, comment 680uF  (value not drawn)
CAP ALUM 680UF 20% 100V RADIAL; Part Number: 100PX680MEFC16X31.5; Manufacturer: Rubycon; TemperatureRange: -55C ~ 105C; Type: Polar; Ripple Current: 900mA; Value: 680uF; PartId: 27237; Supplier 1: Digi-Key; Supplier Part Number 1: 1189-1006-ND; ComponentLink1Description: Datasheet; ComponentLink1URL: http://www.rubycon.co.jp/en/catalog/e_pdfs/aluminum/e_px.pdf; ComponentLink2Description: Digi-Key Listing; ComponentLink2URL: https://www.digikey.com/product-detail/en/rubycon/100PX680MEFC16X31.5/1189-1006-ND/3133934; Tolerance: 20%; Voltage: 100V; Price: 2.5; Device Package: Radial, Can, 16mm
footprint CAP AL TH D16 L7.5 H33.5
pins: 1, 2

## 100RX3047M10X16
designator C?, comment 47uF  (value not drawn)